# Altium footprint library Buttons.PcbLib: 23 footprints (part 1 of 2)
Each footprint in its own frame and in the unit in brackets; x right, y up, seen from the top. Pads: shape width x height; smd on the part's side, far side on the other; paste and mask are expansions set on the pad; w line width, h text height; cw(c..) or ccw(c..) is an arc to the next point about the centre after c.
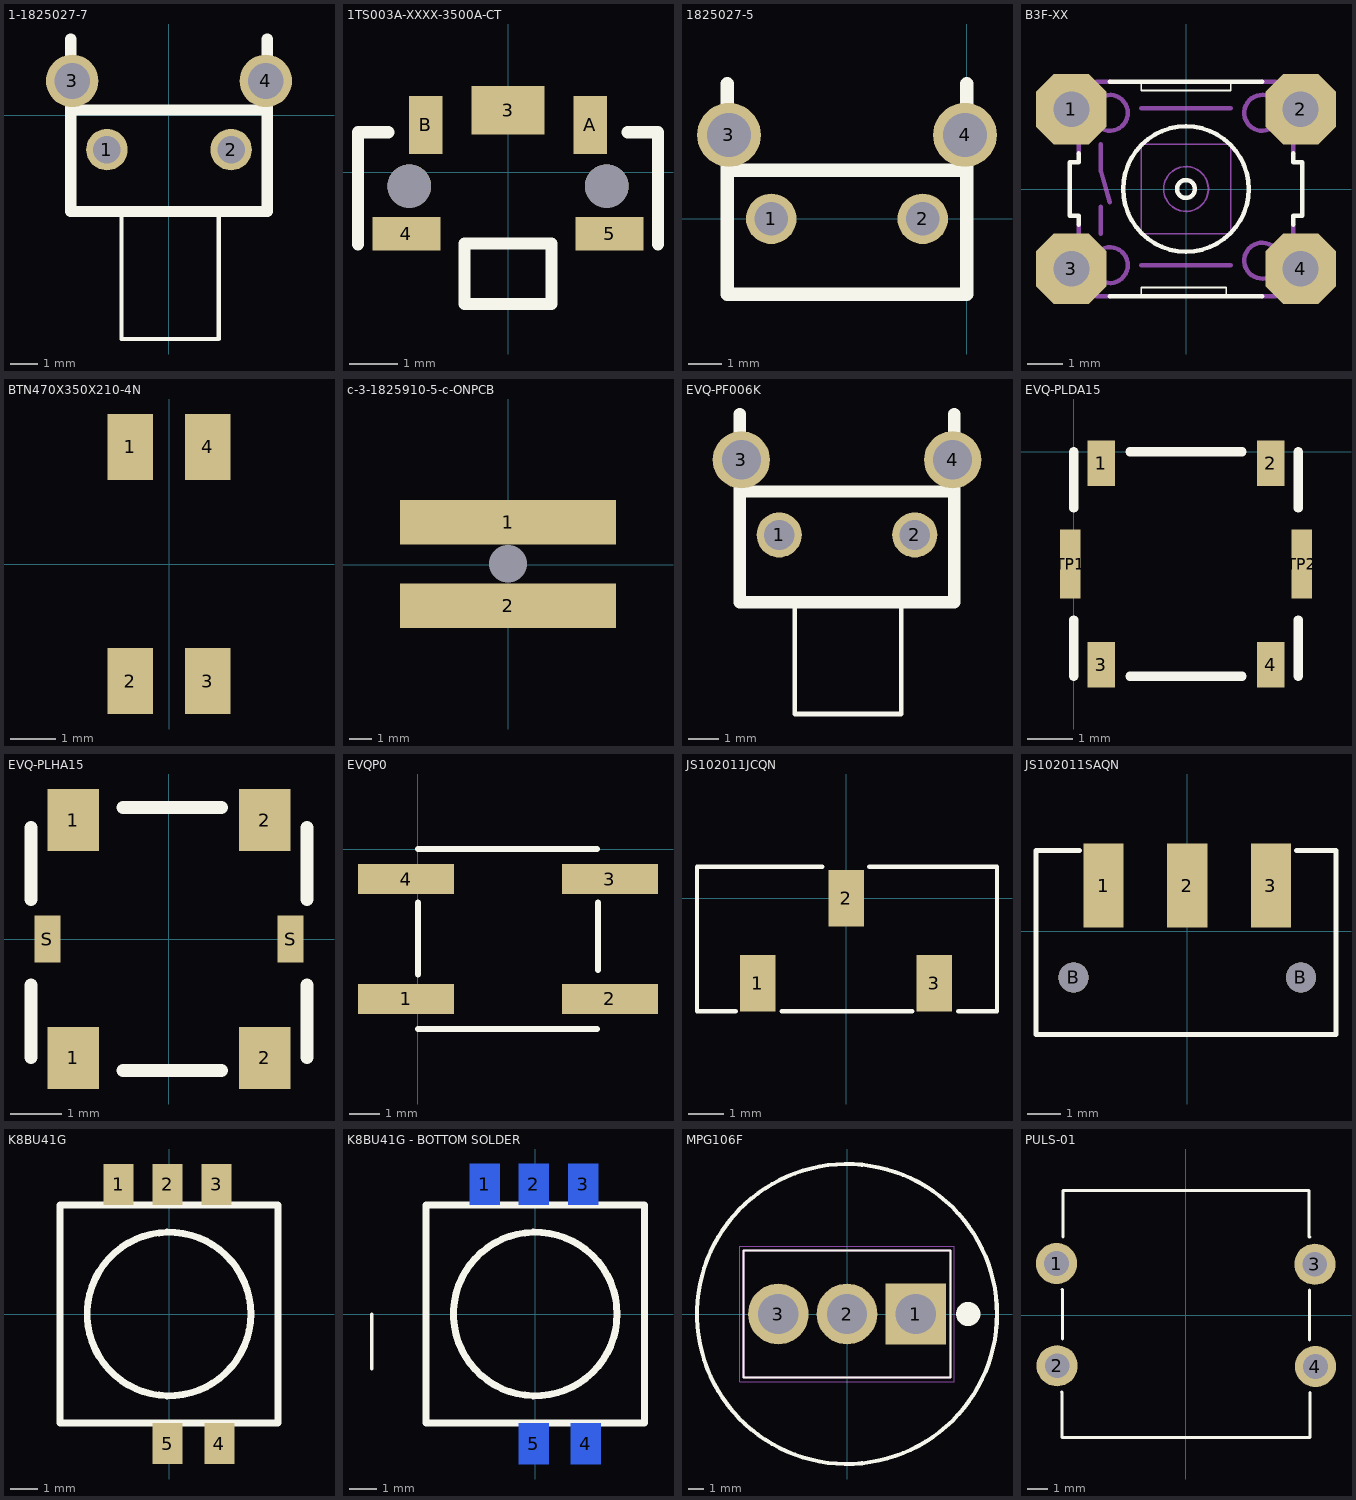
[diagram p0: the footprints below, top view; thin cyan lines are the x and y axes]

## 1-1825027-7 [mm]
pads (4):
  round 1.5 hole 1 mask+0.14: 1(-2.25,-1.245) 2(2.25,-1.245)
  round 1.9 hole 1.3 mask+0.14: 3(-3.505,1.245) 4(3.505,1.245)
Top Overlay:
  lines w0.14: -3.555,-3.485 3.555,-3.485 3.555,0.195 -3.555,0.195 -3.555,-3.485
  lines w0.15: -1.726,-3.531 -1.726,-8.103 1.804,-8.103 1.804,-3.485
  lines w0.41: -3.555,0.195 3.557,0.195 3.557,-3.485 -3.555,-3.485 -3.555,-1.245 -3.555,2.765 ; 3.557,-1.245 3.557,2.765
3D body "c-1-1825027-7-g-3d.stp": height 7.02, standoff -3.49, extent -4.228,-8.128 4.179,2.73

## 1TS003A-XXXX-3500A-CT [mm]
pads (7):
  rect 1.5x1 smd: 3(0,1.275)
  rect 1.4x0.7 smd: 4(-2.1,-1.275) 5(2.1,-1.275)
  rect 0.7x1.2 smd: A(1.7,0.975) B(-1.7,0.975)
  round 0.9 hole 0.9 unplated: ""(-2.04,-0.29) ""(2.04,-0.29)
Top Overlay:
  lines w0.254: -3.1,-1.49 -3.1,0.825 -2.475,0.825 ; -0.9,-1.525 -0.9,-2.725 0.9,-2.725 0.9,-1.525 ; -0.9,-1.475 0.9,-1.475 ; 2.475,0.825 3.1,0.825 3.1,-1.491
3D body "1TS003B.step": height 1.9, standoff -0.4, extent -2.35,-2.4 2.35,1.25

## 1825027-5 [mm]
pads (4):
  round 1.5 hole 1 mask+0.14: 1(-5.807,0) 2(-1.307,0)
  round 1.9 hole 1.3 mask+0.14: 3(-7.062,2.49) 4(-0.052,2.49)
Top Overlay:
  lines w0.14: -7.112,-2.24 -0.002,-2.24 -0.002,1.44 -7.112,1.44 -7.112,-2.24
  lines w0.41: -7.112,1.44 0,1.44 0,-2.24 -7.112,-2.24 -7.112,0 -7.112,4.01 ; 0,0 0,4.01
3D body "SW3dPS-SWITCH3.15MM ACTUATOR.STEP": height 7.01, standoff -3.99, extent -7.256,-3.175 0.144,4.125

## B3F-XX [mil]
pads (4):
  oct 79x79 hole 40: 1(-128,89) 2(128,89) 3(-128,-89) 4(128,-89)
Top Overlay:
  circle w5: c0,0 r10
  circle w5: c0,0 r70
  lines w2: -50,-120 -50,-110 45,-110 45,-120 ; -50,120 -50,110 50,110 50,120
  lines w5: -120,-40 -120,-30 -130,-30 -130,30 -120,30 -120,40 ; -85,-120 -50,-120 45,-120 85,-120 ; -85,120 -50,120 50,120 85,120 ; 120,-40 120,-30 130,-30 130,30 120,30 120,40
Mechanical 16:
  circle w2: c0,0 r25
  circle w5: c-85,85 r20
  circle w5: c85,85 r20
  circle w5: c85,-80 r20
  circle w5: c-85,-85 r20
  lines w2: -50,-50 50,-50 50,50 -50,50 -50,-50
  lines w5: -120,-40 -120,-100 -100,-120 -85,-120 ; -120,40 -120,100 -100,120 -85,120 ; -95,-50 -95,-20 ; -95,50 -95,20 -85,-15 ; -50,-85 50,-85 ; -50,90 50,90 ; 85,-120 100,-120 120,-100 120,-40 ; 85,120 100,120 120,100 120,40
  text "4" at 140,-110 h77.5
  text "3" at -180,-110 h77.5
  text "2" at 140,60 h77.5
  text "1" at -170,65 h77.5

## BTN470X350X210-4N [mm]
pads (4):
  rect 1x1.45 smd: 1(-0.85,2.575) 2(-0.85,-2.575) 3(0.85,-2.575) 4(0.85,2.575)
3D body: height 2.1, standoff 1.65, extent -1,-1.3 1,1.3
3D body: height 1.65, standoff 0.01, extent -1.75,-2.35 1.75,2.35

## c-3-1825910-5-c-ONPCB [mm]
pads (3):
  rect 0x0 hole 1.7 square unplated: 0(0,0.038)
  rect 9.7x2 smd: 1(0,1.905) 2(0,-1.854)
3D body: height 15, standoff -1.6, extent -4.763,-0.762 4.763,0.838
3D body "c-3-1825910-5-c-3d.stp": height 13.99, standoff 8.01, extent -3.91,-9.307 3.889,2.703

## EVQ-PF006K [mm]
pads (4):
  round 1.5 hole 1 mask+0.14: 1(18.399,-9.703) 2(22.899,-9.703)
  round 1.9 hole 1.3 mask+0.14: 3(17.144,-7.213) 4(24.154,-7.213)
Top Overlay:
  lines w0.14: 17.094,-11.943 17.094,-8.263 24.204,-8.263 24.204,-11.943 17.094,-11.943
  lines w0.15: 18.923,-11.989 18.923,-15.646 22.454,-15.646 22.454,-11.943
  lines w0.41: 17.094,-8.263 24.206,-8.263 24.206,-11.943 17.094,-11.943 17.094,-9.703 17.094,-5.693 ; 24.206,-9.703 24.206,-5.693
3D body "EVQPF006K.STEP": height 7.41, standoff -3.49, extent 16.386,-15.589 24.968,-5.739

## EVQ-PLDA15 [mm]
pads (6):
  rect 0.6x1 smd mask+0.14: 1(0.6,-0.25) 2(4.3,-0.25) 3(0.6,-4.65) 4(4.3,-4.65)
  rect 0.45x1.5 smd mask+0.14: TP1(-0.075,-2.45) TP2(4.975,-2.45)
Top Overlay:
  lines w0.2: 0,-4.9 0,-3.675 ; 0,-1.225 0,0 ; 1.225,-4.9 3.675,-4.9 ; 1.225,0 3.675,0 ; 4.9,-4.9 4.9,-3.675 ; 4.9,-1.225 4.9,0
3D body "EVQ-PLD_PLH_PLM_3PL_PT5_PT9-A15.STEP": height 1.51, standoff 0.01, extent 0.014,-4.913 4.914,0.087

## EVQ-PLHA15 [mm]
pads (6):
  rect 1x1.2 smd: 1(-1.85,-2.3) 1(-1.85,2.3) 2(1.85,-2.3) 2(1.85,2.3)
  rect 0.5x0.9 smd: S(-2.35,0) S(2.35,0)
Top Overlay:
  lines w0.254: -2.667,-2.286 -2.667,-0.889 ; -2.667,0.762 -2.667,2.159 ; -0.889,-2.54 1.016,-2.54 ; -0.889,2.54 1.016,2.54 ; 2.667,-2.286 2.667,-0.889 ; 2.667,0.762 2.667,2.159
3D body "EVQ-PLD_PLH_PLM_3PL_PT5_PT9-A15.STEP": height 1.5, standoff 0, extent -2.446,-2.539 2.454,2.461

## EVQP0 [mm]
pads (4):
  rect 3.2x1 smd mask+0.14: 1(-0.4,-5) 2(6.4,-5) 3(6.4,-1) 4(-0.4,-1)
Top Overlay:
  lines w0.2: 0,-6 4.033,-6 5.969,-6 ; 0,-4.191 0,-1.778 ; 0,0 5.969,0 ; 6,-4.033 6,-1.778
3D body "EVQP0-N02B_Q02Q.STEP": height 2.51, standoff 0.01, extent -0.252,-5.97 6.348,0.128

## JS102011JCQN [mm]
pads (3):
  rect 1x1.6 smd: 1(-2.5,-2.4) 2(0,0) 3(2.5,-2.4)
Top Overlay:
  lines w0.127: -3.125,-3.2 -4.225,-3.2 -4.225,0.9 -0.675,0.9 ; -1.825,-3.2 1.875,-3.2 ; 0.65,0.9 4.275,0.9 4.275,-3.2 3.175,-3.2
3D body "js102011jcqn.stp": height 5.61, standoff 0.01, extent -4.225,-3.21 4.275,0.89

## JS102011SAQN [mm]
pads (5):
  rect 1.2x2.5 smd: 1(-2.5,1.375) 2(0,1.375) 3(2.5,1.375)
  round 0.9 hole 0.9 unplated: B(-3.4,-1.375) B(3.4,-1.375)
Top Overlay:
  lines w0.15: -3.225,2.425 -4.525,2.425 -4.525,-3.075 4.45,-3.075 4.45,2.425 3.275,2.425
3D body "js102011saqn.stp": height 3.23, standoff -1.07, extent -4.55,-5.095 4.45,2.405

## K8BU41G [mm] "SWITCH TACTILE SPST-NO 0.05A 32V"
pads (5):
  rect 1.1x1.5 smd: 1(-1.85,4.75) 2(-0.05,4.75) 3(1.75,4.75) 4(1.85,-4.75) 5(-0.05,-4.75)
Top Overlay:
  circle w0.254: c0,0 r3
  lines w0.254: -4,-4 -4,0 -4,4 4,4 4,-4 -4,-4
3D body: height 9.23, standoff -7.3, extent -4,-4 -4,-4
3D body: height 9.23, standoff -7.3, extent -1,-1 -1,-1
3D body "K8BU41GLFS.stp": height 6.01, standoff -0.09, extent -4.2,-5.408 4.2,5.408

## K8BU41G - BOTTOM SOLDER [mm]
pads (5):
  rect 1.1x1.5 smd far side: 1(-1.85,4.75) 2(-0.05,4.75) 3(1.75,4.75) 4(1.85,-4.75) 5(-0.05,-4.75)
Top Overlay:
  circle w0.254: c0,0 r3
  lines w0.127: -6,-2 -6,0
  lines w0.254: -4,-4 -4,0 -4,4 4,4 4,-4 -4,-4
3D body: height 9.23, standoff -7.3, extent -4,-4 -4,-4
3D body: height 9.23, standoff -7.3, extent -1,-1 -1,-1
3D body "K8BU41GLFS.stp": height 4.19, standoff -1.92, extent -4.2,-5.408 4.2,5.408

## MPG106F [mil]
pads (3):
  rect 150x150 hole 100: 1(170,0)
  round 150 hole 100: 2(0,0) 3(-170,0)
Top Overlay:
  circle w10: c0,0 r371.21
  circle w30: c300,0 r15
  lines w5: -256,-157.5 256,-157.5 256,157.5 -256,157.5 -256,-157.5
Mechanical 4:
  circle w30: c172.05,0 r15
  circle w30: c172.05,0 r15
  lines w5: -256,-157.5 256,-157.5 ; -256,-157.5 -256,157.5 ; -256,-157.5 256,-157.5 ; -256,-157.5 -256,157.5 ; -256,157.5 256,157.5 ; -256,157.5 256,157.5 ; 256,-157.5 256,157.5 ; 256,-157.5 256,157.5
Mechanical 16:
  lines w1.97: -265.84,-167.34 -265.84,167.34 265.84,167.34 265.84,-167.34 -265.84,-167.34
3D body "c-5-1437567-0-d-3d.stp": height 1268.5, standoff -106.5, extent -355.5,-355.47 375.5,355.49

## PULS-01 [mm]
pads (4):
  round 2 hole 1.2: 1(-6.274,2.5) 2(-6.248,-2.464) 3(6.26,2.464) 4(6.286,-2.5)
Top Overlay:
  lines w0.15: -6.045,-3.734 -6.02,-3.734 -6.02,-5.944 6.02,-5.944 6.02,-3.759 ; -6.02,1.245 -5.994,1.245 -5.994,-1.168 ; -5.969,3.785 -5.969,6.045 5.969,6.045 5.969,3.785 6.02,3.785 ; 5.994,-1.219 5.994,1.219
3D body: height 3.8, standoff 0, extent 3.949,-5.071 4.945,-4.073
3D body: height 3.8, standoff 0, extent -4.814,-5.071 -3.818,-4.073
3D body: height 3.8, standoff 0, extent -4.814,4.073 -3.818,5.071
3D body: height 3.8, standoff 0, extent 3.949,4.073 4.945,5.071
3D body: height 3.6, standoff 0.1, extent -5.521,-5.619 5.533,5.619
3D body: height 3.5, standoff 0, extent -5.969,-5.969 5.969,6.096
3D body: height 4, standoff 3.5, extent -3.55,-3.547 3.55,3.547
3D body: height 7.5, standoff 5.8, extent -1.65,-1.647 1.65,1.647
3D body: height 7.5, standoff 0, extent -1.488,-1.497 1.5,1.497
3D body: height 8.08, standoff 6.6, extent -6.5,-6.5 6.5,6.5
3D body: height 12.3, standoff 6.6, extent -5.744,-5.747 5.756,5.747
3D body: height 2, standoff -4, extent 6.095,2.009 6.476,2.898
3D body: height 2, standoff -4, extent 6.095,-2.944 6.476,-2.055
3D body: height 2, standoff -4, extent -6.439,-2.908 -6.058,-2.019
3D body: height 2, standoff -4, extent -6.439,2.045 -6.058,2.934